# Altium footprint library Gesturelink PCB Library.PcbLib: 57 footprints (part 2 of 4)
Each footprint in its own frame and in the unit in brackets; x right, y up, seen from the top. Pads: shape width x height; smd on the part's side, far side on the other; paste and mask are expansions set on the pad; w line width, h text height; cw(c..) or ccw(c..) is an arc to the next point about the centre after c.
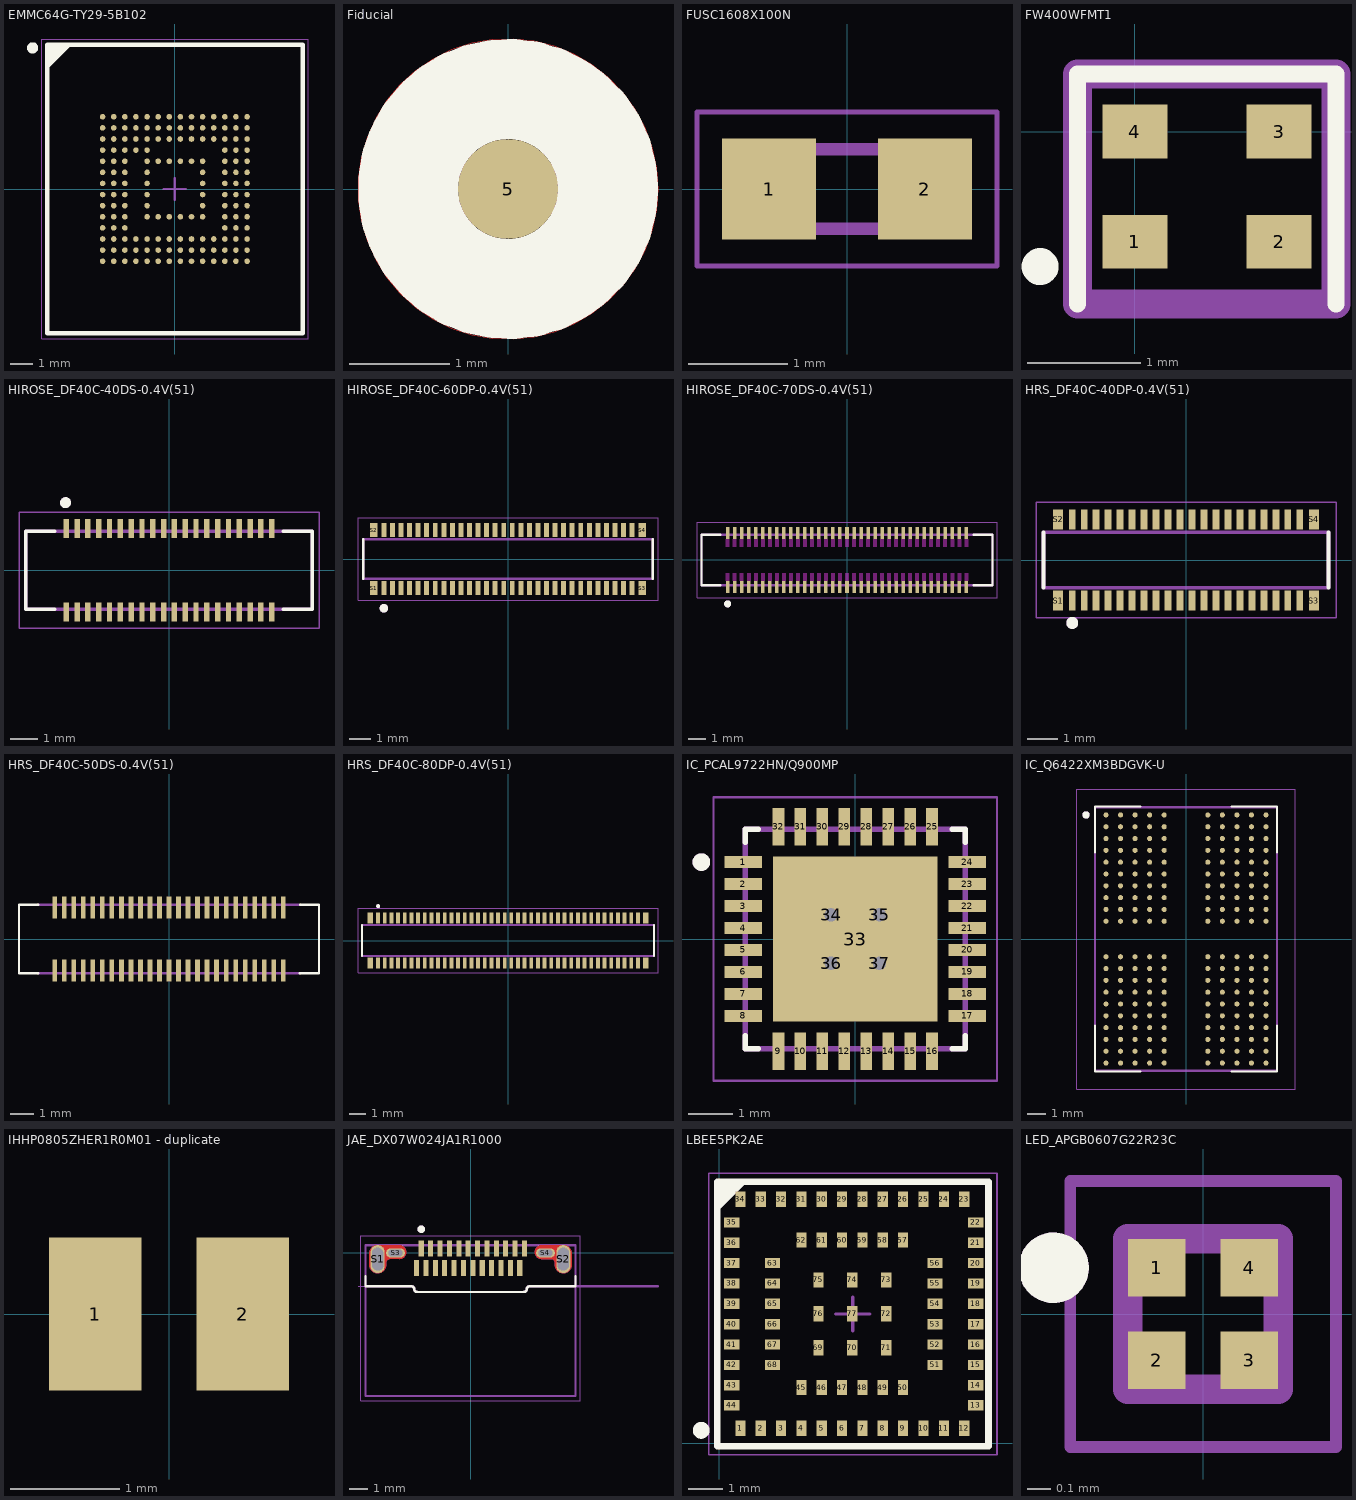
[diagram p1: the footprints below, top view; thin cyan lines are the x and y axes]

## EMMC64G-TY29-5B102 [mm]
pads (154):
  round 0.25 smd: A1(-3.25,3.25) A2(-2.75,3.25) A3(-2.25,3.25) A4(-1.75,3.25) A5(-1.25,3.25) A6(-0.75,3.25) A7(-0.25,3.25) A8(0.25,3.25) A9(0.75,3.25) A10(1.25,3.25) A11(1.75,3.25) A12(2.25,3.25) A13(2.75,3.25) A14(3.25,3.25) B1(-3.25,2.75) B2(-2.75,2.75) B3(-2.25,2.75) B4(-1.75,2.75) B5(-1.25,2.75) B6(-0.75,2.75) B7(-0.25,2.75) B8(0.25,2.75) B9(0.75,2.75) B10(1.25,2.75) B11(1.75,2.75) B12(2.25,2.75) B13(2.75,2.75) B14(3.25,2.75) C1(-3.25,2.25) C2(-2.75,2.25) C3(-2.25,2.25) C4(-1.75,2.25) C5(-1.25,2.25) C6(-0.75,2.25) C7(-0.25,2.25) C8(0.25,2.25) C9(0.75,2.25) C10(1.25,2.25) C11(1.75,2.25) C12(2.25,2.25) C13(2.75,2.25) C14(3.25,2.25) D1(-3.25,1.75) D2(-2.75,1.75) D3(-2.25,1.75) D4(-1.75,1.75) D5(-1.25,1.75) D12(2.25,1.75) D13(2.75,1.75) D14(3.25,1.75) E1(-3.25,1.25) E2(-2.75,1.25) E3(-2.25,1.25) E5(-1.25,1.25) E6(-0.75,1.25) E7(-0.25,1.25) E8(0.25,1.25) E9(0.75,1.25) E10(1.25,1.25) E12(2.25,1.25) E13(2.75,1.25) E14(3.25,1.25) F1(-3.25,0.75) F2(-2.75,0.75) F3(-2.25,0.75) F5(-1.25,0.75) F10(1.25,0.75) F12(2.25,0.75) F13(2.75,0.75) F14(3.25,0.75) G1(-3.25,0.25) G2(-2.75,0.25) G3(-2.25,0.25) G5(-1.25,0.25) G10(1.25,0.25) G12(2.25,0.25) G13(2.75,0.25) G14(3.25,0.25) H1(-3.25,-0.25) H2(-2.75,-0.25) H3(-2.25,-0.25) H5(-1.25,-0.25) H10(1.25,-0.25) H12(2.25,-0.25) H13(2.75,-0.25) H14(3.25,-0.25) J1(-3.25,-0.75) J2(-2.75,-0.75) J3(-2.25,-0.75) J5(-1.25,-0.75) J10(1.25,-0.75) J12(2.25,-0.75) J13(2.75,-0.75) J14(3.25,-0.75) K1(-3.25,-1.25) K2(-2.75,-1.25) K3(-2.25,-1.25) K5(-1.25,-1.25) K6(-0.75,-1.25) K7(-0.25,-1.25) K8(0.25,-1.25) K9(0.75,-1.25) K10(1.25,-1.25) K12(2.25,-1.25) K13(2.75,-1.25) K14(3.25,-1.25) L1(-3.25,-1.75) L2(-2.75,-1.75) L3(-2.25,-1.75) L12(2.25,-1.75) L13(2.75,-1.75) L14(3.25,-1.75) M1(-3.25,-2.25) M2(-2.75,-2.25) M3(-2.25,-2.25) M4(-1.75,-2.25) M5(-1.25,-2.25) M6(-0.75,-2.25) M7(-0.25,-2.25) M8(0.25,-2.25) M9(0.75,-2.25) M10(1.25,-2.25) M11(1.75,-2.25) M12(2.25,-2.25) M13(2.75,-2.25) M14(3.25,-2.25) N1(-3.25,-2.75) N2(-2.75,-2.75) N3(-2.25,-2.75) N4(-1.75,-2.75) N5(-1.25,-2.75) N6(-0.75,-2.75) N7(-0.25,-2.75) N8(0.25,-2.75) N9(0.75,-2.75) N10(1.25,-2.75) N11(1.75,-2.75) N12(2.25,-2.75) N13(2.75,-2.75) N14(3.25,-2.75) P1(-3.25,-3.25) P2(-2.75,-3.25) P3(-2.25,-3.25) P4(-1.75,-3.25) P5(-1.25,-3.25) P6(-0.75,-3.25) P7(-0.25,-3.25) P8(0.25,-3.25) P9(0.75,-3.25) P10(1.25,-3.25) P11(1.75,-3.25) P12(2.25,-3.25) P13(2.75,-3.25) P14(3.25,-3.25)
Top Overlay:
  circle w0.25: c-6.4,6.35 r0.125
  region: -4.75,6.5 -5.75,5.5 -5.75,6.5
  lines w0.2: -5.75,5.5 -4.75,6.5 ; -5.75,-6.5 -5.75,6.5 5.75,6.5 5.75,-6.5 -5.75,-6.5
Mechanical 13:
  lines w0.1: -5.75,-6.5 -5.75,6.5 5.75,6.5 5.75,-6.5 -5.75,-6.5
Mechanical 15:
  lines w0.05: -6,-6.75 -6,6.75 6,6.75 6,-6.75 -6,-6.75
  lines w0.1: -0.5,0 0.5,0 ; 0,-0.5 0,0.5
3D body: height 0.73, standoff 0.21, extent -5.75,-6.5 5.75,6.5

## Fiducial [mm]
pads (1):
  round 1 smd paste-1 mask+1: 5(0,0)
Top Layer:
  circle w0.01: c0,0 r1.5
Top Overlay:
  circle w1: c0,0 r1
3D body: height 0.08, standoff -0.02, extent -0.492,-0.5 0.508,0.5

## FUSC1608X100N [mm]
height 1
pads (2):
  rect 0.95x1.02 smd: 1(-0.785,0) 2(0.785,0)
Mechanical 13:
  lines w0.127: -0.8,-0.4 -0.8,0.4 0.8,0.4 0.8,-0.4 -0.8,-0.4
Mechanical 15:
  lines w0.05: -1.51,-0.775 -1.51,0.775 1.51,0.775 1.51,-0.775 -1.51,-0.775
3D body "step_temp.STEP": height 1, standoff 0, extent -0.8,-0.4 0.8,0.4

## FW400WFMT1 [mm]
pads (4):
  rect 0.575x0.475 smd: 1(0,-0.975) 2(1.275,-0.975) 3(1.275,0) 4(0,0)
Top Overlay:
  circle w0.254: c-0.838,-1.194 r0.036
  lines w0.152: -0.508,-1.524 -0.508,0.508 1.778,0.508 1.778,-1.524
Mechanical 15:
  lines w0.254: -0.508,-1.524 1.778,-1.524 1.778,0.508 -0.508,0.508 -0.508,-1.524
3D body "FW400WFMT1.step": height 0.55, standoff -0.02, extent -0.374,-1.308 1.626,0.292

## HIROSE_DF40C-40DS-0.4V(51) [mm]
pads (40):
  rect 0.2x0.7 smd paste-1: 1(-3.8,-1.54) 2(-3.8,1.54) 3(-3.4,-1.54) 4(-3.4,1.54) 5(-3,-1.54) 6(-3,1.54) 7(-2.6,-1.54) 8(-2.6,1.54) 9(-2.2,-1.54) 10(-2.2,1.54) 11(-1.8,-1.54) 12(-1.8,1.54) 13(-1.4,-1.54) 14(-1.4,1.54) 15(-1,-1.54) 16(-1,1.54) 17(-0.6,-1.54) 18(-0.6,1.54) 19(-0.2,-1.54) 20(-0.2,1.54) 21(0.2,-1.54) 22(0.2,1.54) 23(0.6,-1.54) 24(0.6,1.54) 25(1,-1.54) 26(1,1.54) 27(1.4,-1.54) 28(1.4,1.54) 29(1.8,-1.54) 30(1.8,1.54) 31(2.2,-1.54) 32(2.2,1.54) 33(2.6,-1.54) 34(2.6,1.54) 35(3,-1.54) 36(3,1.54) 37(3.4,-1.54) 38(3.4,1.54) 39(3.8,-1.54) 40(3.8,1.54)
Top Overlay:
  circle w0.2: c-3.83,2.5 r0.1
  lines w0.127: -4.22,-1.44 -5.3,-1.44 -5.3,1.44 -4.22,1.44 ; 4.22,-1.44 5.3,-1.44 5.3,1.44 4.22,1.44
Top Paste:
  drawing of 40 lines, arcs and shapes, not listed
Mechanical 1:
  text "1.54" at -1.88,4.699 h1.52
Mechanical 13:
  circle w0.2: c-3.83,2.5 r0.1
  lines w0.127: -5.3,-1.44 5.3,-1.44 5.3,1.44 -5.3,1.44 -5.3,-1.44
Mechanical 15:
  lines w0.05: -5.55,-2.14 -5.55,2.14 5.55,2.14 5.55,-2.14 -5.55,-2.14
3D body "df40c-40ds-0_4v_51_.stp": height 1.45, standoff 0, extent -5.313,-1.69 5.287,1.69

## HIROSE_DF40C-60DP-0.4V(51) [mm]
pads (64):
  rect 0.23x0.66 smd paste-1: 1(-5.8,-1.355) 2(-5.8,1.355) 3(-5.4,-1.355) 4(-5.4,1.355) 5(-5,-1.355) 6(-5,1.355) 7(-4.6,-1.355) 8(-4.6,1.355) 9(-4.2,-1.355) 10(-4.2,1.355) 11(-3.8,-1.355) 12(-3.8,1.355) 13(-3.4,-1.355) 14(-3.4,1.355) 15(-3,-1.355) 16(-3,1.355) 17(-2.6,-1.355) 18(-2.6,1.355) 19(-2.2,-1.355) 20(-2.2,1.355) 21(-1.8,-1.355) 22(-1.8,1.355) 23(-1.4,-1.355) 24(-1.4,1.355) 25(-1,-1.355) 26(-1,1.355) 27(-0.6,-1.355) 28(-0.6,1.355) 29(-0.2,-1.355) 30(-0.2,1.355) 31(0.2,-1.355) 32(0.2,1.355) 33(0.6,-1.355) 34(0.6,1.355) 35(1,-1.355) 36(1,1.355) 37(1.4,-1.355) 38(1.4,1.355) 39(1.8,-1.355) 40(1.8,1.355) 41(2.2,-1.355) 42(2.2,1.355) 43(2.6,-1.355) 44(2.6,1.355) 45(3,-1.355) 46(3,1.355) 47(3.4,-1.355) 48(3.4,1.355) 49(3.8,-1.355) 50(3.8,1.355) 51(4.2,-1.355) 52(4.2,1.355) 53(4.6,-1.355) 54(4.6,1.355) 55(5,-1.355) 56(5,1.355) 57(5.4,-1.355) 58(5.4,1.355) 59(5.8,-1.355) 60(5.8,1.355)
  rect 0.35x0.66 smd paste-1: S1(-6.275,-1.355) S2(-6.275,1.355) S3(6.275,-1.355) S4(6.275,1.355)
Top Overlay:
  circle w0.2: c-5.8,-2.3 r0.1
  lines w0.127: -6.76,-0.925 -6.76,0.925 ; 6.76,-0.925 6.76,0.925
Top Paste:
  drawing of 64 lines, arcs and shapes, not listed
Mechanical 13:
  circle w0.2: c-5.8,-2.3 r0.1
  lines w0.127: -6.76,-0.925 -6.76,0.925 6.76,0.925 6.76,-0.925 -6.76,-0.925
Mechanical 15:
  lines w0.05: -7.01,-1.935 -7.01,1.935 7.01,1.935 7.01,-1.935 -7.01,-1.935
3D body "DF40C-60DP.stp": height 1.14, standoff 0, extent -6.769,-1.485 6.751,1.485

## HIROSE_DF40C-70DS-0.4V(51) [mm]
pads (70):
  rect 0.2x0.7 smd paste-1: 1(-6.8,-1.54) 2(-6.8,1.54) 3(-6.4,-1.54) 4(-6.4,1.54) 5(-6,-1.54) 6(-6,1.54) 7(-5.6,-1.54) 8(-5.6,1.54) 9(-5.2,-1.54) 10(-5.2,1.54) 11(-4.8,-1.54) 12(-4.8,1.54) 13(-4.4,-1.54) 14(-4.4,1.54) 15(-4,-1.54) 16(-4,1.54) 17(-3.6,-1.54) 18(-3.6,1.54) 19(-3.2,-1.54) 20(-3.2,1.54) 21(-2.8,-1.54) 22(-2.8,1.54) 23(-2.4,-1.54) 24(-2.4,1.54) 25(-2,-1.54) 26(-2,1.54) 27(-1.6,-1.54) 28(-1.6,1.54) 29(-1.2,-1.54) 30(-1.2,1.54) 31(-0.8,-1.54) 32(-0.8,1.54) 33(-0.4,-1.54) 34(-0.4,1.54) 35(0,-1.54) 36(0,1.54) 37(0.4,-1.54) 38(0.4,1.54) 39(0.8,-1.54) 40(0.8,1.54) 41(1.2,-1.54) 42(1.2,1.54) 43(1.6,-1.54) 44(1.6,1.54) 45(2,-1.54) 46(2,1.54) 47(2.4,-1.54) 48(2.4,1.54) 49(2.8,-1.54) 50(2.8,1.54) 51(3.2,-1.54) 52(3.2,1.54) 53(3.6,-1.54) 54(3.6,1.54) 55(4,-1.54) 56(4,1.54) 57(4.4,-1.54) 58(4.4,1.54) 59(4.8,-1.54) 60(4.8,1.54) 61(5.2,-1.54) 62(5.2,1.54) 63(5.6,-1.54) 64(5.6,1.54) 65(6,-1.54) 66(6,1.54) 67(6.4,-1.54) 68(6.4,1.54) 69(6.8,-1.54) 70(6.8,1.54)
Top Overlay:
  circle w0.2: c-6.8,-2.5 r0.1
  lines w0.127: -7.22,-1.44 -8.3,-1.44 -8.3,1.44 -7.22,1.44 ; 7.22,-1.44 8.3,-1.44 8.3,1.44 7.22,1.44
Top Paste:
  drawing of 70 lines, arcs and shapes, not listed
Keep-Out Layer:
  drawing of 140 lines, arcs and shapes, not listed
Mechanical 13:
  circle w0.2: c-6.8,-2.5 r0.1
  lines w0.127: -8.3,-1.44 -8.3,1.44 8.3,1.44 8.3,-1.44 -8.3,-1.44
Mechanical 15:
  lines w0.05: -8.55,-2.14 -8.55,2.14 8.55,2.14 8.55,-2.14 -8.55,-2.14
3D body "DF40C-70DS-0.4V-51---3DModel-STEP-56544.STEP": height 1.65, standoff 0, extent -8.3,-1.69 8.3,1.69

## HRS_DF40C-40DP-0.4V(51) [mm]
pads (44):
  rect 0.23x0.66 smd: 1(-3.8,-1.355) 2(-3.8,1.355) 3(-3.4,-1.355) 4(-3.4,1.355) 5(-3,-1.355) 6(-3,1.355) 7(-2.6,-1.355) 8(-2.6,1.355) 9(-2.2,-1.355) 10(-2.2,1.355) 11(-1.8,-1.355) 12(-1.8,1.355) 13(-1.4,-1.355) 14(-1.4,1.355) 15(-1,-1.355) 16(-1,1.355) 17(-0.6,-1.355) 18(-0.6,1.355) 19(-0.2,-1.355) 20(-0.2,1.355) 21(0.2,-1.355) 22(0.2,1.355) 23(0.6,-1.355) 24(0.6,1.355) 25(1,-1.355) 26(1,1.355) 27(1.4,-1.355) 28(1.4,1.355) 29(1.8,-1.355) 30(1.8,1.355) 31(2.2,-1.355) 32(2.2,1.355) 33(2.6,-1.355) 34(2.6,1.355) 35(3,-1.355) 36(3,1.355) 37(3.4,-1.355) 38(3.4,1.355) 39(3.8,-1.355) 40(3.8,1.355)
  rect 0.35x0.66 smd: S1(-4.275,-1.355) S2(-4.275,1.355) S3(4.275,-1.355) S4(4.275,1.355)
Top Overlay:
  circle w0.2: c-3.8,-2.1 r0.1
  lines w0.127: -4.76,-0.925 -4.76,0.925 ; 4.76,-0.925 4.76,0.925
Mechanical 13:
  circle w0.2: c-3.8,-2.1 r0.1
  lines w0.127: -4.76,-0.925 -4.76,0.925 4.76,0.925 4.76,-0.925 -4.76,-0.925
Mechanical 15:
  lines w0.05: -5.01,-1.935 -5.01,1.935 5.01,1.935 5.01,-1.935 -5.01,-1.935
3D body "DF40C-40DP.stp": height 1.14, standoff 0, extent -4.77,-1.54 4.75,1.43

## HRS_DF40C-50DS-0.4V(51) [mm]
pads (50):
  rect 0.2x0.92 smd: 1(-4.8,-1.32) 2(-4.4,-1.32) 3(-4,-1.32) 4(-3.6,-1.32) 5(-3.2,-1.32) 6(-2.8,-1.32) 7(-2.4,-1.32) 8(-2,-1.32) 9(-1.6,-1.32) 10(-1.2,-1.32) 11(-0.8,-1.32) 12(-0.4,-1.32) 13(0,-1.32) 14(0.4,-1.32) 15(0.8,-1.32) 16(1.2,-1.32) 17(1.6,-1.32) 18(2,-1.32) 19(2.4,-1.32) 20(2.8,-1.32) 21(3.2,-1.32) 22(3.6,-1.32) 23(4,-1.32) 24(4.4,-1.32) 25(4.8,-1.32) 26(4.8,1.32) 27(4.4,1.32) 28(4,1.32) 29(3.6,1.32) 30(3.2,1.32) 31(2.8,1.32) 32(2.4,1.32) 33(2,1.32) 34(1.6,1.32) 35(1.2,1.32) 36(0.8,1.32) 37(0.4,1.32) 38(0,1.32) 39(-0.4,1.32) 40(-0.8,1.32) 41(-1.2,1.32) 42(-1.6,1.32) 43(-2,1.32) 44(-2.4,1.32) 45(-2.8,1.32) 46(-3.2,1.32) 47(-3.6,1.32) 48(-4,1.32) 49(-4.4,1.32) 50(-4.8,1.32)
Top Overlay:
  lines w0.1: -5.499,-1.44 -6.301,-1.44 -6.301,1.438 -5.499,1.438 ; 5.499,-1.44 6.301,-1.44 6.301,1.44 5.501,1.44
Mechanical 13:
  lines w0.1: -5.501,1.44 5.501,1.44 ; -5.499,-1.44 5.499,-1.44 ; 5.501,1.44 5.501,1.441
3D body "step_temp.STEP": height 1.45, standoff 0, extent -6.328,-1.69 6.272,1.69

## HRS_DF40C-80DP-0.4V(51) [mm]
height 1.29
pads (84):
  rect 0.23x0.66 smd paste-1: 1(-7.8,1.355) 2(-7.8,-1.355) 3(-7.4,1.355) 4(-7.4,-1.355) 5(-7,1.355) 6(-7,-1.355) 7(-6.6,1.355) 8(-6.6,-1.355) 9(-6.2,1.355) 10(-6.2,-1.355) 11(-5.8,1.355) 12(-5.8,-1.355) 13(-5.4,1.355) 14(-5.4,-1.355) 15(-5,1.355) 16(-5,-1.355) 17(-4.6,1.355) 18(-4.6,-1.355) 19(-4.2,1.355) 20(-4.2,-1.355) 21(-3.8,1.355) 22(-3.8,-1.355) 23(-3.4,1.355) 24(-3.4,-1.355) 25(-3,1.355) 26(-3,-1.355) 27(-2.6,1.355) 28(-2.6,-1.355) 29(-2.2,1.355) 30(-2.2,-1.355) 31(-1.8,1.355) 32(-1.8,-1.355) 33(-1.4,1.355) 34(-1.4,-1.355) 35(-1,1.355) 36(-1,-1.355) 37(-0.6,1.355) 38(-0.6,-1.355) 39(-0.2,1.355) 40(-0.2,-1.355) 41(0.2,1.355) 42(0.2,-1.355) 43(0.6,1.355) 44(0.6,-1.355) 45(1,1.355) 46(1,-1.355) 47(1.4,1.355) 48(1.4,-1.355) 49(1.8,1.355) 50(1.8,-1.355) 51(2.2,1.355) 52(2.2,-1.355) 53(2.6,1.355) 54(2.6,-1.355) 55(3,1.355) 56(3,-1.355) 57(3.4,1.355) 58(3.4,-1.355) 59(3.8,1.355) 60(3.8,-1.355) 61(4.2,1.355) 62(4.2,-1.355) 63(4.6,1.355) 64(4.6,-1.355) 65(5,1.355) 66(5,-1.355) 67(5.4,1.355) 68(5.4,-1.355) 69(5.8,1.355) 70(5.8,-1.355) 71(6.2,1.355) 72(6.2,-1.355) 73(6.6,1.355) 74(6.6,-1.355) 75(7,1.355) 76(7,-1.355) 77(7.4,1.355) 78(7.4,-1.355) 79(7.8,1.355) 80(7.8,-1.355)
  rect 0.35x0.66 smd paste-1: S1(-8.275,1.355) S2(-8.275,-1.355) S3(8.275,1.355) S4(8.275,-1.355)
Top Overlay:
  circle w0.12: c-7.8,2.065 r0.06
  lines w0.127: -8.76,-0.925 -8.76,0.925 ; 8.76,-0.925 8.76,0.925
Top Paste:
  drawing of 84 lines, arcs and shapes, not listed
Mechanical 13:
  circle w0.12: c-7.8,2.065 r0.06
  lines w0.127: -8.76,-0.925 8.76,-0.925 8.76,0.925 -8.76,0.925 -8.76,-0.925
  text "Metal Mask Thickness: 120um" at -9.01,-3.8 h0.41
Mechanical 15:
  lines w0.05: -9.01,-1.935 9.01,-1.935 9.01,1.935 -9.01,1.935 -9.01,-1.935
3D body "DF40C-80DP.stp": height 1.14, standoff 0, extent -8.775,-1.51 8.745,1.46

## IC_PCAL9722HN/Q900MP [mm]
height 0.85
pads (37):
  rect 0.85x0.27 smd: 1(-2.55,1.75) 2(-2.55,1.25) 3(-2.55,0.75) 4(-2.55,0.25) 5(-2.55,-0.25) 6(-2.55,-0.75) 7(-2.55,-1.25) 8(-2.55,-1.75) 17(2.55,-1.75) 18(2.55,-1.25) 19(2.55,-0.75) 20(2.55,-0.25) 21(2.55,0.25) 22(2.55,0.75) 23(2.55,1.25) 24(2.55,1.75)
  rect 0.27x0.85 smd: 9(-1.75,-2.55) 10(-1.25,-2.55) 11(-0.75,-2.55) 12(-0.25,-2.55) 13(0.25,-2.55) 14(0.75,-2.55) 15(1.25,-2.55) 16(1.75,-2.55) 25(1.75,2.55) 26(1.25,2.55) 27(0.75,2.55) 28(0.25,2.55) 29(-0.25,2.55) 30(-0.75,2.55) 31(-1.25,2.55) 32(-1.75,2.55)
  rect 3.75x3.75 smd paste-3: 33(0,0)
  round 0.6 hole 0.3 mask+0: 34(-0.55,0.55) 35(0.55,0.55) 36(-0.55,-0.55) 37(0.55,-0.55)
Top Overlay:
  circle w0.2: c-3.5,1.75 r0.1
  lines w0.127: -2.5,-2.205 -2.5,-2.5 -2.205,-2.5 ; -2.5,2.205 -2.5,2.5 -2.205,2.5 ; 2.205,-2.5 2.5,-2.5 2.5,-2.205 ; 2.205,2.5 2.5,2.5 2.5,2.205
Top Paste:
  drawing of 9 lines, arcs and shapes, not listed
Mechanical 13:
  circle w0.2: c-3.5,1.75 r0.1
  lines w0.127: -2.5,-2.5 2.5,-2.5 2.5,2.5 -2.5,2.5 -2.5,-2.5
Mechanical 15:
  lines w0.05: -3.225,-3.225 -3.225,3.225 3.225,3.225 3.225,-3.225 -3.225,-3.225
3D body "PCAL9722HN_Q900MP.STEP": height 0.88, standoff 0.03, extent -2.515,-2.485 2.485,2.515

## IC_Q6422XM3BDGVK-U [mm]
height 1
pads (200):
  round 0.28 smd: A1(-4.4,6.825) A2(-3.6,6.825) A3(-2.8,6.825) A4(-2,6.825) A5(-1.2,6.825) A8(1.2,6.825) A9(2,6.825) A10(2.8,6.825) A11(3.6,6.825) A12(4.4,6.825) AA1(-4.4,-6.175) AA2(-3.6,-6.175) AA3(-2.8,-6.175) AA4(-2,-6.175) AA5(-1.2,-6.175) AA8(1.2,-6.175) AA9(2,-6.175) AA10(2.8,-6.175) AA11(3.6,-6.175) AA12(4.4,-6.175) AB1(-4.4,-6.825) AB2(-3.6,-6.825) AB3(-2.8,-6.825) AB4(-2,-6.825) AB5(-1.2,-6.825) AB8(1.2,-6.825) AB9(2,-6.825) AB10(2.8,-6.825) AB11(3.6,-6.825) AB12(4.4,-6.825) B1(-4.4,6.175) B2(-3.6,6.175) B3(-2.8,6.175) B4(-2,6.175) B5(-1.2,6.175) B8(1.2,6.175) B9(2,6.175) B10(2.8,6.175) B11(3.6,6.175) B12(4.4,6.175) C1(-4.4,5.525) C2(-3.6,5.525) C3(-2.8,5.525) C4(-2,5.525) C5(-1.2,5.525) C8(1.2,5.525) C9(2,5.525) C10(2.8,5.525) C11(3.6,5.525) C12(4.4,5.525) D1(-4.4,4.875) D2(-3.6,4.875) D3(-2.8,4.875) D4(-2,4.875) D5(-1.2,4.875) D8(1.2,4.875) D9(2,4.875) D10(2.8,4.875) D11(3.6,4.875) D12(4.4,4.875) E1(-4.4,4.225) E2(-3.6,4.225) E3(-2.8,4.225) E4(-2,4.225) E5(-1.2,4.225) E8(1.2,4.225) E9(2,4.225) E10(2.8,4.225) E11(3.6,4.225) E12(4.4,4.225) F1(-4.4,3.575) F2(-3.6,3.575) F3(-2.8,3.575) F4(-2,3.575) F5(-1.2,3.575) F8(1.2,3.575) F9(2,3.575) F10(2.8,3.575) F11(3.6,3.575) F12(4.4,3.575) G1(-4.4,2.925) G2(-3.6,2.925) G3(-2.8,2.925) G4(-2,2.925) G5(-1.2,2.925) G8(1.2,2.925) G9(2,2.925) G10(2.8,2.925) G11(3.6,2.925) G12(4.4,2.925) H1(-4.4,2.275) H2(-3.6,2.275) H3(-2.8,2.275) H4(-2,2.275) H5(-1.2,2.275) H8(1.2,2.275) H9(2,2.275) H10(2.8,2.275) H11(3.6,2.275) H12(4.4,2.275) J1(-4.4,1.625) J2(-3.6,1.625) J3(-2.8,1.625) J4(-2,1.625) J5(-1.2,1.625) J8(1.2,1.625) J9(2,1.625) J10(2.8,1.625) J11(3.6,1.625) J12(4.4,1.625) K1(-4.4,0.975) K2(-3.6,0.975) K3(-2.8,0.975) K4(-2,0.975) K5(-1.2,0.975) K8(1.2,0.975) K9(2,0.975) K10(2.8,0.975) K11(3.6,0.975) K12(4.4,0.975) N1(-4.4,-0.975) N2(-3.6,-0.975) N3(-2.8,-0.975) N4(-2,-0.975) N5(-1.2,-0.975) N8(1.2,-0.975) N9(2,-0.975) N10(2.8,-0.975) N11(3.6,-0.975) N12(4.4,-0.975) P1(-4.4,-1.625) P2(-3.6,-1.625) P3(-2.8,-1.625) P4(-2,-1.625) P5(-1.2,-1.625) P8(1.2,-1.625) P9(2,-1.625) P10(2.8,-1.625) P11(3.6,-1.625) P12(4.4,-1.625) R1(-4.4,-2.275) R2(-3.6,-2.275) R3(-2.8,-2.275) R4(-2,-2.275) R5(-1.2,-2.275) R8(1.2,-2.275) R9(2,-2.275) R10(2.8,-2.275) R11(3.6,-2.275) R12(4.4,-2.275) T1(-4.4,-2.925) T2(-3.6,-2.925) T3(-2.8,-2.925) T4(-2,-2.925) T5(-1.2,-2.925) T8(1.2,-2.925) T9(2,-2.925) T10(2.8,-2.925) T11(3.6,-2.925) T12(4.4,-2.925) U1(-4.4,-3.575) U2(-3.6,-3.575) U3(-2.8,-3.575) U4(-2,-3.575) U5(-1.2,-3.575) U8(1.2,-3.575) U9(2,-3.575) U10(2.8,-3.575) U11(3.6,-3.575) U12(4.4,-3.575) V1(-4.4,-4.225) V2(-3.6,-4.225) V3(-2.8,-4.225) V4(-2,-4.225) V5(-1.2,-4.225) V8(1.2,-4.225) V9(2,-4.225) V10(2.8,-4.225) V11(3.6,-4.225) V12(4.4,-4.225) W1(-4.4,-4.875) W2(-3.6,-4.875) W3(-2.8,-4.875) W4(-2,-4.875) W5(-1.2,-4.875) W8(1.2,-4.875) W9(2,-4.875) W10(2.8,-4.875) W11(3.6,-4.875) W12(4.4,-4.875) Y1(-4.4,-5.525) Y2(-3.6,-5.525) Y3(-2.8,-5.525) Y4(-2,-5.525) Y5(-1.2,-5.525) Y8(1.2,-5.525) Y9(2,-5.525) Y10(2.8,-5.525) Y11(3.6,-5.525) Y12(4.4,-5.525)
Top Overlay:
  circle w0.2: c-5.5,6.825 r0.1
  lines w0.127: -5,-4.77 -5,-7.285 -2.5,-7.285 ; -5,4.77 -5,7.285 -2.5,7.285 ; 2.5,-7.285 5,-7.285 5,-4.77 ; 2.5,7.285 5,7.285 5,4.77
Mechanical 13:
  circle w0.2: c-5.5,6.825 r0.1
  lines w0.127: -5,-7.25 5,-7.25 5,7.25 -5,7.25 -5,-7.25
Mechanical 15:
  lines w0.05: -6,-8.25 6,-8.25 6,8.25 -6,8.25 -6,-8.25
3D body "step_temp.STEP": height 1, standoff 0, extent -5,-7.25 5,7.25

## IHHP0805ZHER1R0M01 - duplicate [mm]
pads (2):
  rect 0.85x1.4 smd: 1(-0.675,0) 2(0.675,0)
3D body "IHHP0805ZHER1R0M01--3DModel-STEP-269445.STEP": height 0.79, standoff 0, extent -0.953,-0.597 1.053,0.597

## JAE_DX07W024JA1R1000 [mm]
height 4.8
pads (28):
  rect 0.27x0.85 smd: A1(-2.625,0.245) A2(-2.125,0.245) A3(-1.625,0.245) A4(-1.125,0.245) A5(-0.625,0.245) A6(-0.125,0.245) A7(0.375,0.245) A8(0.875,0.245) A9(1.375,0.245) A10(1.875,0.245) A11(2.375,0.245) A12(2.875,0.245) B1(2.625,-0.805) B2(2.125,-0.805) B3(1.625,-0.805) B4(1.125,-0.805) B5(0.625,-0.805) B6(0.125,-0.805) B7(-0.375,-0.805) B8(-0.875,-0.805) B9(-1.375,-0.805) B10(-1.875,-0.805) B11(-2.375,-0.805) B12(-2.875,-0.805)
  oval 0.75x1.5 hole 0.6 slot 1.2 at 90 deg mask+0: S1(-4.95,-0.33) S2(4.95,-0.33)
  oval 1x0.5 hole 0.35 slot 0.75 at 0 deg mask+0: S3(-4,0) S4(4,0)
Top Layer:
  region: 183 vertices and 0 holes, not listed, extent -5.4,-1.08 -3.428,0.42
  region: 183 vertices and 0 holes, not listed, extent 3.428,-1.08 5.4,0.42
Bottom Layer:
  region: 183 vertices and 0 holes, not listed, extent -5.4,-1.08 -3.428,0.42
  region: 183 vertices and 0 holes, not listed, extent 3.428,-1.08 5.4,0.42
Top Overlay:
  circle w0.2: c-2.625,1.27 r0.1
  lines w0.127: -5.6,-1.25 -5.6,-1.78 -3.15,-1.78 cw(c-3.15,-1.93) -3,-1.93 ccw(c-2.85,-1.93) -2.85,-2.08 2.85,-2.08 ccw(c2.85,-1.93) 3,-1.93 cw(c3.15,-1.93) 3.15,-1.78 5.6,-1.78 5.6,-1.25
Top Solder:
  drawing of 2 lines, arcs and shapes, not listed
Bottom Solder:
  drawing of 2 lines, arcs and shapes, not listed
Mechanical 1:
  lines w0: -6,-1.78 -3.15,-1.78 cw(c-3.15,-1.93) -3,-1.93 ccw(c-2.85,-1.93) -2.85,-2.08 2.85,-2.08 ccw(c2.85,-1.93) 3,-1.93 cw(c3.15,-1.93) 3.15,-1.78 6,-1.78
Mechanical 13:
  circle w0.2: c-2.625,1.27 r0.1
  lines w0.127: 10,-1.78 5.6,-1.78 ; -5.6,-1.78 -5.6,-7.63 5.6,-7.63 5.6,-1.78 ; -5.6,-1.78 -5.6,0.42 5.6,0.42 5.6,-1.78 ; -5.6,-1.78 -3.15,-1.78 cw(c-3.15,-1.93) -3,-1.93 ccw(c-2.85,-1.93) -2.85,-2.08 2.85,-2.08 ccw(c2.85,-1.93) 3,-1.93 cw(c3.15,-1.93) 3.15,-1.78 5.6,-1.78
  text "PCB EDGE" at 6,-1.5 h0.81
Mechanical 15:
  lines w0.05: -5.85,-7.88 5.85,-7.88 5.85,0.92 -5.85,0.92 -5.85,-7.88
3D body "step_temp.STEP": height 3.6, standoff -0.9, extent -5.6,-7.63 5.6,0.42

## LBEE5PK2AE [mm]
height 1.15
pads (77):
  rect 0.3x0.45 smd: 1(0.62,0.44) 2(1.22,0.44) 3(1.82,0.44) 4(2.42,0.44) 5(3.02,0.44) 6(3.62,0.44) 7(4.22,0.44) 8(4.82,0.44) 9(5.415,0.44) 10(6.02,0.44) 11(6.62,0.44) 12(7.22,0.44) 23(7.22,7.19) 24(6.62,7.19) 25(6.02,7.19) 26(5.415,7.19) 27(4.82,7.19) 28(4.22,7.19) 29(3.62,7.19) 30(3.02,7.19) 31(2.42,7.19) 32(1.82,7.19) 33(1.22,7.19) 34(0.62,7.19) 45(2.42,1.64) 46(3.02,1.64) 47(3.62,1.64) 48(4.22,1.64) 49(4.82,1.64) 50(5.415,1.64) 57(5.415,5.99) 58(4.82,5.99) 59(4.22,5.99) 60(3.62,5.99) 61(3.02,5.99) 62(2.42,5.99) 69(2.92,2.815) 70(3.92,2.815) 71(4.92,2.815) 72(4.92,3.815) 73(4.92,4.815) 74(3.92,4.815) 75(2.92,4.815) 76(2.92,3.815) 77(3.92,3.815)
  rect 0.45x0.3 smd: 13(7.56,1.12) 14(7.56,1.71) 15(7.56,2.31) 16(7.56,2.91) 17(7.56,3.51) 18(7.56,4.11) 19(7.56,4.71) 20(7.56,5.31) 21(7.56,5.91) 22(7.56,6.51) 35(0.37,6.51) 36(0.37,5.91) 37(0.37,5.31) 38(0.37,4.71) 39(0.37,4.11) 40(0.37,3.51) 41(0.37,2.91) 42(0.37,2.31) 43(0.37,1.71) 44(0.37,1.12) 51(6.36,2.31) 52(6.36,2.91) 53(6.36,3.51) 54(6.36,4.11) 55(6.36,4.71) 56(6.36,5.31) 63(1.57,5.31) 64(1.57,4.71) 65(1.57,4.11) 66(1.57,3.51) 67(1.57,2.91) 68(1.57,2.31)
Top Overlay:
  circle w0.25: c-0.533,0.381 r0.125
  region: 0.701,7.71 -0.063,6.946 -0.063,7.71
  lines w0.2: -0.063,6.946 0.701,7.71 ; -0.063,-0.09 -0.063,7.71 7.937,7.71 7.937,-0.09 -0.063,-0.09
Mechanical 13:
  lines w0.1: -0.063,-0.09 -0.063,7.71 7.937,7.71 7.937,-0.09 -0.063,-0.09
Mechanical 15:
  lines w0.05: -0.313,-0.34 -0.313,7.96 8.187,7.96 8.187,-0.34 -0.313,-0.34
  lines w0.1: 3.437,3.81 4.437,3.81 ; 3.937,3.31 3.937,4.31
3D body "WIFI MODULE STEP FILE 1.STEP": height 1.16, standoff -0.1, extent 0.001,-0.115 8.001,7.685

## LED_APGB0607G22R23C [mm]
height 0.3
pads (4):
  rect 0.25x0.25 smd mask+0.05: 1(-0.2,0.2) 2(-0.2,-0.2) 3(0.2,-0.2) 4(0.2,0.2)
Top Overlay:
  circle w0.152: c-0.646,0.2 r0.076
Mechanical 13:
  circle w0.152: c-0.646,0.2 r0.076
  lines w0.127: -0.325,-0.325 0.325,-0.325 0.325,0.325 -0.325,0.325 -0.325,-0.325
Mechanical 15:
  lines w0.05: -0.575,-0.575 -0.575,0.575 0.575,0.575 0.575,-0.575 -0.575,-0.575